# Altium footprint library rcl.PCBLIB: 513 footprints (part 20 of 33)
Each footprint in its own frame and in the unit in brackets; x right, y up, seen from the top. Pads: shape width x height; smd on the part's side, far side on the other; paste and mask are expansions set on the pad; w line width, h text height; cw(c..) or ccw(c..) is an arc to the next point about the centre after c.
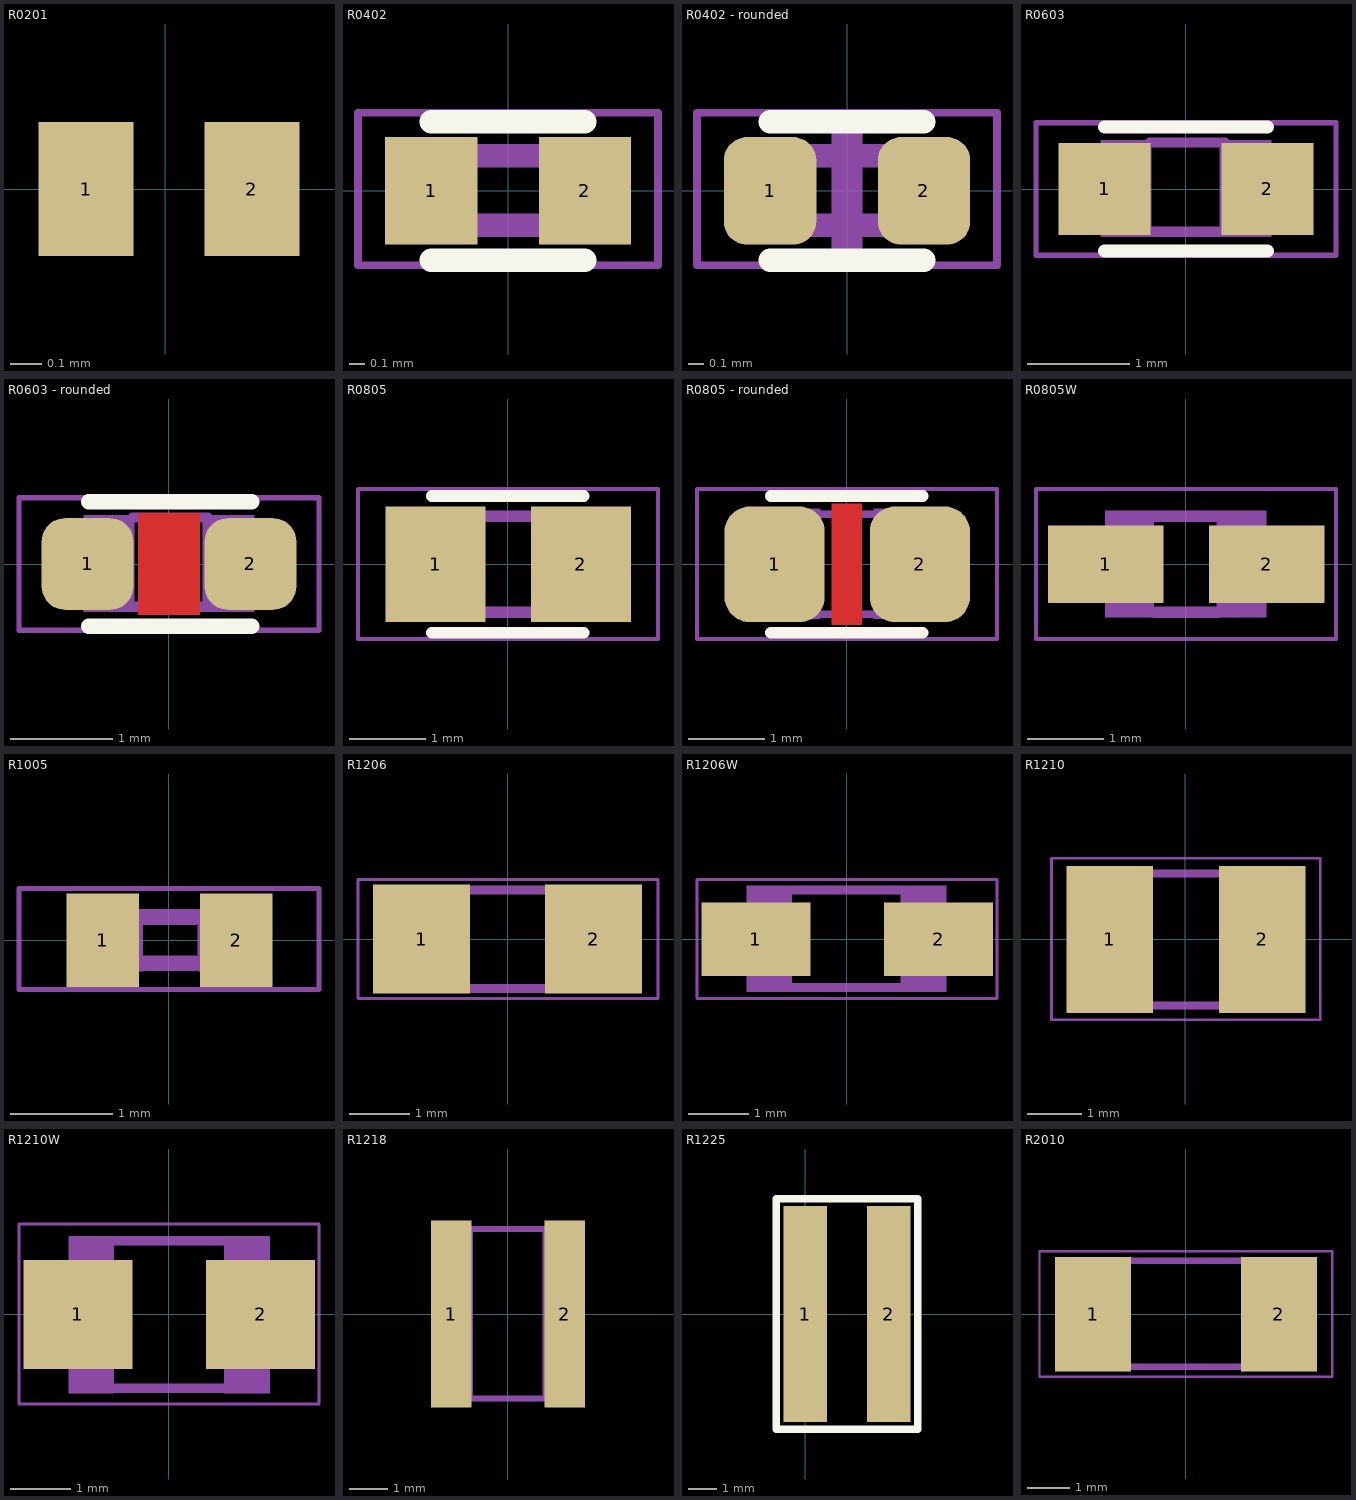
[diagram p19: the footprints below, top view; thin cyan lines are the x and y axes]

## R0201 [mil]
pads (2):
  rect 12x17 smd: 1(-10.04,0) 2(11,0)
Mechanical 4:
  rectangle: 6,-5.91 12,6
  rectangle: -11.81,-5.91 -5.91,6

## R0402 [mm]
pads (2):
  rect 0.6x0.7 smd: 1(-0.5,0) 2(0.5,0)
Top Overlay:
  lines w0.152: -0.5,-0.45 0.5,-0.45 ; -0.5,0.45 0.5,0.45
Mechanical 4:
  rectangle: 0.279,-0.305 0.559,0.305
  rectangle: -0.554,-0.305 -0.254,0.305
  lines w0.051: -0.975,-0.483 -0.975,0.508 0.975,0.508 0.975,-0.483 -0.975,-0.483
  lines w0.152: -0.245,-0.224 0.254,-0.224 ; -0.245,0.229 0.254,0.229
3D body "User Library-R_0402.step": height 0.35, standoff 0, extent -0.5,-0.25 0.5,0.25

## R0402 - rounded [mm]
pads (2):
  rrect50% 0.6x0.7 smd: 1(-0.5,0) 2(0.5,0)
Top Overlay:
  lines w0.152: -0.5,-0.45 0.5,-0.45 ; -0.5,0.45 0.5,0.45
Mechanical 4:
  rectangle: 0.279,-0.305 0.559,0.305
  rectangle: -0.554,-0.305 -0.254,0.305
  lines w0.051: -0.975,-0.483 -0.975,0.508 0.975,0.508 0.975,-0.483 -0.975,-0.483
  lines w0.152: -0.245,-0.224 0.254,-0.224 ; -0.245,0.229 0.254,0.229
Mechanical 13:
  pour cut-out: -0.1,0.4 0.1,0.4 0.1,-0.4 -0.1,-0.4
3D body "User Library-R_0402.step": height 0.35, standoff 0, extent -0.5,-0.25 0.5,0.25

## R0603 [mm]
pads (2):
  rect 0.9x0.9 smd: 1(-0.8,0) 2(0.8,0)
Top Overlay:
  lines w0.127: -0.8,-0.61 0.8,-0.61 ; -0.8,0.61 0.8,0.61
Mechanical 4:
  rectangle: -0.838,-0.47 -0.338,0.483
  rectangle: 0.33,-0.47 0.838,0.483
  lines w0.051: -1.473,-0.65 1.473,-0.65 1.473,0.65 -1.473,0.65 -1.473,-0.65
  lines w0.102: -0.356,-0.419 0.381,-0.419 ; -0.356,0.457 0.381,0.457
3D body "User Library-RESC1608X05N.step": height 0.45, standoff 0, extent -0.775,-0.425 0.775,0.425

## R0603 - rounded [mm]
pads (2):
  rrect50% 0.9x0.9 smd: 1(-0.8,0) 2(0.8,0)
Top Layer:
  pour cut-out: -0.3,0.5 0.3,0.5 0.3,-0.5 -0.3,-0.5
Top Overlay:
  lines w0.152: -0.787,-0.61 0.813,-0.61 ; -0.787,0.61 0.813,0.61
Mechanical 4:
  rectangle: 0.33,-0.47 0.838,0.483
  rectangle: -0.838,-0.47 -0.338,0.483
  lines w0.051: -1.473,-0.65 -1.473,0.65 1.473,0.65 1.473,-0.65 -1.473,-0.65
  lines w0.102: -0.356,-0.419 0.381,-0.419 ; -0.356,0.457 0.381,0.457
3D body "User Library-RESC1608X05N.step": height 0.45, standoff 0, extent -0.775,-0.425 0.775,0.425

## R0805 [mil]
pads (2):
  rect 52x60 smd: 1(-37.4,0) 2(38,0)
Top Overlay:
  lines w6: -39.37,-35.43 39.37,-35.43 ; -39.37,35.43 39.37,35.43
Mechanical 4:
  rectangle: -42,-27.5 -16.41,28
  rectangle: 16,-27.5 42,28
  lines w2: -77.68,-38.7 -77.68,39 78,39 78,-38.7 -77.68,-38.7
  lines w6: -16.14,-25 17,-25 ; -16.14,25 17,25
3D body "User Library-RES_2013-0805.step": height 29.92, standoff 0, extent -45.27,-26.57 45.28,26.58

## R0805 - rounded [mil]
pads (2):
  rrect50% 52x60 smd: 1(-37.4,0) 2(38,0)
Top Layer:
  pour cut-out: -7.87,31.5 -7.87,-31.5 7.87,-31.5 7.87,31.5
Top Overlay:
  lines w6: -39.37,-35.43 39.37,-35.43 ; -39.37,35.43 39.37,35.43
Mechanical 4:
  rectangle: -43,-28.5 -13.47,29
  rectangle: 14,-28.5 44,29
  lines w2: -77.68,-38.7 78,-38.7 78,39 -77.68,39 -77.68,-38.7
  lines w4: -15,26 15,26 ; -14.02,-25.98 15,-25.98
3D body "User Library-RES_2013-0805.step": height 29.92, standoff 0, extent -45.27,-26.57 45.28,26.58

## R0805W [mil]
pads (2):
  rect 60x40 smd: 1(-41.44,0) 2(42,0)
Mechanical 4:
  rectangle: -42,-27.5 -16.41,28
  rectangle: 16,-27.5 42,28
  lines w2: -77.68,-38.7 -77.68,39 78,39 78,-38.7 -77.68,-38.7
  lines w6: -16.14,-25 17,-25 ; -16.14,25 17,25
3D body "User Library-RES_2013-0805.step": height 29.92, standoff 0, extent -45.27,-26.57 45.28,26.58

## R1005 [mil]
pads (2):
  rect 28x36 smd: 1(-25.59,0) 2(26,0)
Mechanical 4:
  rectangle: -21.81,-12 -10,12
  rectangle: 11,-12 22,12
  lines w2: -57.99,-19.02 58,-19.02 58,20 -57.99,20 -57.99,-19.02
  lines w6: -9.65,-8.82 10,-8.82 ; -9.65,9 10,9

## R1206 [mil]
pads (2):
  rect 63x71 smd: 1(-55.98,0) 2(56,0)
Mechanical 4:
  rectangle: 38,-34.5 67,35
  rectangle: -66.5,-34.5 -37.5,35
  lines w2: -97.36,-38.7 -97.36,39 98,39 98,-38.7 -97.36,-38.7
  lines w6: -38,-32 38,-32 ; -38,32 38,32
3D body "User Library-R_1206.step": height 23.62, standoff 0, extent -62.99,-31.49 62.99,31.5

## R1206W [mil]
pads (2):
  rect 71x48 smd: 1(-59.02,0) 2(60,0)
Mechanical 4:
  rectangle: 35,-34.5 65,35
  rectangle: -65,-34.5 -35.47,35
  lines w2: -97.36,-38.7 -97.36,39 98,39 98,-38.7 -97.36,-38.7
  lines w6: -35.94,-31.5 35,-31.5 ; -35.94,32 35,32
3D body "User Library-R_1206.step": height 23.62, standoff 0, extent -62.99,-31.49 63,31.5

## R1210 [mil]
pads (2):
  rect 63x107 smd: 1(-55.12,0) 2(56,0)
Mechanical 4:
  rectangle: 36,-51.5 66,51
  rectangle: -65,-51.5 -35.47,51
  lines w2: -97.36,-58.39 -97.36,59 98,59 98,-58.39 -97.36,-58.39
  lines w6: -35.94,-47.99 37,-47.99 ; -35.94,48 37,48

## R1210W [mil]
pads (2):
  rect 71x71 smd: 1(-59.02,0) 2(60,0)
Mechanical 4:
  rectangle: 36,-51.5 66,51
  rectangle: -65,-51.5 -35.47,51
  lines w2: -97.36,-58.39 -97.36,59 98,59 98,-58.39 -97.36,-58.39
  lines w6: -35.94,-47.99 37,-47.99 ; -35.94,48 37,48

## R1218 [mil]
pads (2):
  rect 42x193 smd: 1(-58.07,0) 2(59,0)
Mechanical 4:
  rectangle: -65,-90.55 -35.47,91
  rectangle: 36,-90.55 66,91
  lines w6: -36.97,88 36,88 ; -35.94,-87.36 37,-87.36

## R1225 [mm]
pads (2):
  rect 1.5x7.5 smd: 1(0,0) 2(2.9,0)
Top Overlay:
  lines w0.254: -1,-4 3.9,-4 3.9,4 -1,4 -1,-4
3D body "User Library-wk733a.step": height 0.61, standoff 0, extent -0.1,-3.15 3,3.15

## R2010 [mil]
pads (2):
  rect 71x107 smd: 1(-86.61,0) 2(87,0)
Mechanical 4:
  rectangle: -98,-52 -64.54,53
  rectangle: 65,-52 99,53
  lines w2: -136.73,-58.39 137,-58.39 137,59 -136.73,59 -136.73,-58.39
  lines w6: -65.43,50 66,50 ; -64.45,-49.02 67,-49.02